# Altium footprint library pcblib.PcbLib: 92 footprints (part 6 of 6)
Each footprint in its own frame and in the unit in brackets; x right, y up, seen from the top. Pads: shape width x height; smd on the part's side, far side on the other; paste and mask are expansions set on the pad; w line width, h text height; cw(c..) or ccw(c..) is an arc to the next point about the centre after c.
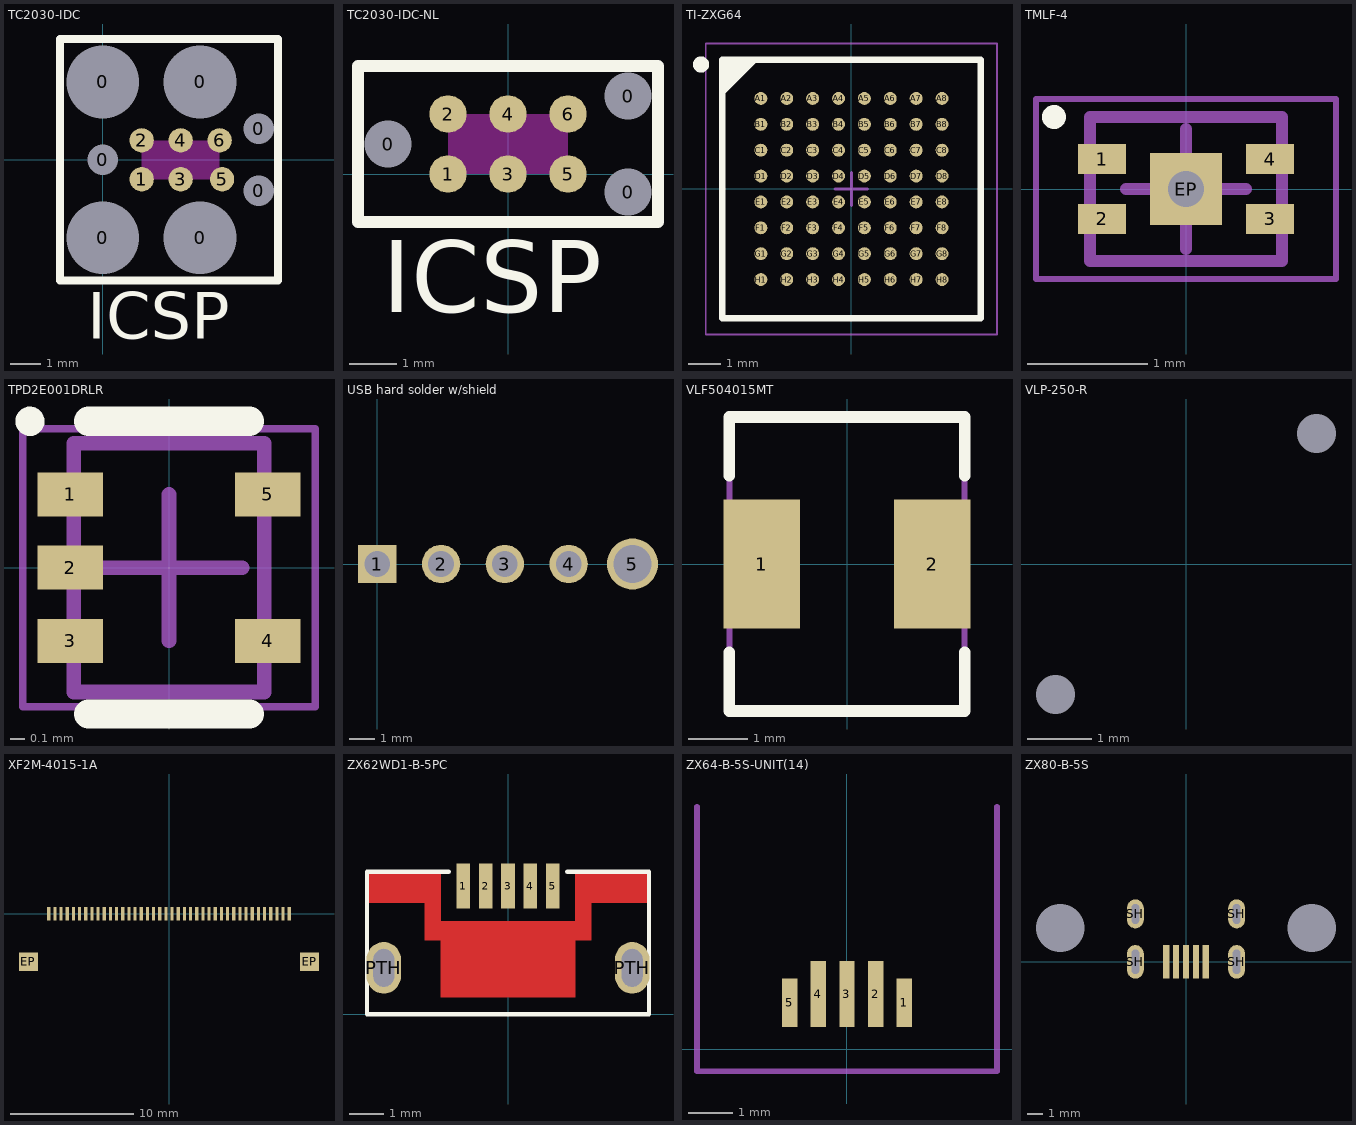
[diagram p5: the footprints below, top view; thin cyan lines are the x and y axes]

## TC2030-IDC [mm] "Tag-Connect 6-Pin with Legs (PN# TC2030-IDC-NL)"
pads (13):
  round 2.3 hole 2.375 unplated: 0(0,-2.54) 0(0,2.54) 0(3.175,-2.54) 0(3.175,2.54)
  round 0.9 hole 0.995 unplated: 0(0,0) 0(5.08,-1.016) 0(5.08,1.016)
  round 0.79 smd paste-0.39 mask-0.102: 1(1.27,-0.635)
  round 0.79 smd paste-0.39: 2(1.27,0.635) 3(2.54,-0.635) 4(2.54,0.635) 5(3.89,-0.635) 6(3.81,0.635)
Top Overlay:
  lines w0.254: -1.397,-3.937 -1.397,3.937 5.715,3.937 5.715,-3.937 -1.397,-3.937
  text "ICSP" at -0.508,-5.842 h1.52
Keep-Out Layer:
  rectangle: 1.27,-0.635 3.81,0.635

## TC2030-IDC-NL [mm] "Tag-Connect 6-Pin with No Legs (PN# TC2030-IDC-NL)"
pads (9):
  round 0.9 hole 0.995 unplated: 0(-2.54,0.635) 0(2.54,-0.381) 0(2.54,1.651)
  round 0.79 smd paste-0.39: 1(-1.27,0) 2(-1.27,1.27) 3(0,0) 4(0,1.27) 5(1.27,0) 6(1.27,1.27)
Top Overlay:
  lines w0.254: -3.175,-1.016 -3.175,2.286 3.175,2.286 3.175,-1.016 -3.175,-1.016
  text "ICSP" at -2.667,-2.921 h1.52
Keep-Out Layer:
  rectangle: -1.27,0 1.27,1.27

## TI-ZXG64 [mm] "BGA, 64-Balls, Body 8x8mm, Pitch 0.8mm"
height 1.45
pads (64):
  round 0.4 smd: A1(-2.8,2.8) A2(-2,2.8) A3(-1.2,2.8) A4(-0.4,2.8) A5(0.4,2.8) A6(1.2,2.8) A7(2,2.8) A8(2.8,2.8) B1(-2.8,2) B2(-2,2) B3(-1.2,2) B4(-0.4,2) B5(0.4,2) B6(1.2,2) B7(2,2) B8(2.8,2) C1(-2.8,1.2) C2(-2,1.2) C3(-1.2,1.2) C4(-0.4,1.2) C5(0.4,1.2) C6(1.2,1.2) C7(2,1.2) C8(2.8,1.2) D1(-2.8,0.4) D2(-2,0.4) D3(-1.2,0.4) D4(-0.4,0.4) D5(0.4,0.4) D6(1.2,0.4) D7(2,0.4) D8(2.8,0.4) E1(-2.8,-0.4) E2(-2,-0.4) E3(-1.2,-0.4) E4(-0.4,-0.4) E5(0.4,-0.4) E6(1.2,-0.4) E7(2,-0.4) E8(2.8,-0.4) F1(-2.8,-1.2) F2(-2,-1.2) F3(-1.2,-1.2) F4(-0.4,-1.2) F5(0.4,-1.2) F6(1.2,-1.2) F7(2,-1.2) F8(2.8,-1.2) G1(-2.8,-2) G2(-2,-2) G3(-1.2,-2) G4(-0.4,-2) G5(0.4,-2) G6(1.2,-2) G7(2,-2) G8(2.8,-2) H1(-2.8,-2.8) H2(-2,-2.8) H3(-1.2,-2.8) H4(-0.4,-2.8) H5(0.4,-2.8) H6(1.2,-2.8) H7(2,-2.8) H8(2.8,-2.8)
Top Overlay:
  circle w0.25: c-4.65,3.85 r0.125
  region: -3,4 -4,3 -4,4
  lines w0.2: -4,3 -3,4 ; -4,-4 4,-4 4,4 -4,4 -4,-4
Mechanical 13:
  lines w0.1: -4,-4 4,-4 4,4 -4,4 -4,-4
Mechanical 15:
  lines w0.05: -4.5,-4.5 4.5,-4.5 4.5,4.5 -4.5,4.5 -4.5,-4.5
  lines w0.1: -0.5,0 0.5,0 ; 0,-0.5 0,0.5
3D body: height 1.45, standoff 0.31, extent -4,-4 4,4

## TMLF-4 [mm] "4-Pin 1.2mm x 1.6mm Thin MLF"
height 0.55
pads (5):
  rect 0.4x0.25 smd: 1(-0.7,0.25) 2(-0.7,-0.25) 3(0.7,-0.25) 4(0.7,0.25)
  rect 0.6x0.6 smd: EP(0,0)
via 0,0 diameter 0.4 hole 0.3
Top Overlay:
  circle w0.1: c-1.1,0.6 r0.05
Mechanical 13:
  lines w0.1: -0.8,-0.6 -0.8,0.6 0.8,0.6 0.8,-0.6 -0.8,-0.6
Mechanical 15:
  lines w0.05: -1.25,-0.75 -1.25,0.75 1.25,0.75 1.25,-0.75 -1.25,-0.75
  lines w0.1: -0.5,0 0.5,0 ; 0,-0.5 0,0.5
3D body: height 1.5, standoff 0, extent -0.6,-0.6 0.7,0.6
3D body: height 0.55, standoff 0, extent -0.8,-0.6 0.8,0.6

## TPD2E001DRLR [mm] "SOTFL, 5-Flat Leads, Body 1.2x1.6x0.6mm, Pitch 0.5mm, TI Recommended"
height 0.6
pads (5):
  rect 0.45x0.3 smd: 1(-0.675,0.5) 2(-0.675,0) 3(-0.675,-0.5) 4(0.675,-0.5) 5(0.675,0.5)
Top Overlay:
  circle w0.1: c-0.95,1 r0.05
  lines w0.2: -0.55,-1 0.55,-1 ; -0.55,1 0.55,1
Mechanical 13:
  lines w0.1: -0.65,-0.85 0.65,-0.85 0.65,0.85 -0.65,0.85 -0.65,-0.85
Mechanical 15:
  lines w0.05: -1,-0.95 1,-0.95 1,0.95 -1,0.95 -1,-0.95
  lines w0.1: -0.5,0 0.5,0 ; 0,-0.5 0,0.5
3D body: height 0.6, standoff 0, extent -0.65,-0.85 0.65,0.85

## USB hard solder w/shield [mm] "Vias for USB with additional via for Shield"
pads (5):
  rect 1.53x1.53 hole 1.02: 1(0,0)
  round 1.53 hole 1.02: 2(2.54,0) 3(5.08,0) 4(7.62,0)
  round 2.032 hole 1.524: 5(10.16,0)

## VLF504015MT [mm] "SMD INDUCTOR, 2-Leads, Body 4x5mm"
height 1.5
pads (2):
  rect 1.3x2.2 smd: 1(-1.45,0) 2(1.45,0)
Top Overlay:
  lines w0.2: -2,-1.5 -2,-2.5 2,-2.5 2,-1.5 ; -2,1.5 -2,2.5 2,2.5 2,1.5
Mechanical 13:
  lines w0.1: -2,-2.5 -2,2.5 2,2.5 2,-2.5 -2,-2.5
3D body: height 1.5, standoff 0, extent -2,-2.5 2,2.5

## VLP-250-R [mil] "LIGHT PIPE VERTICAL .250\" ROUND"
pads (2):
  round 0 hole 24 unplated: MH(-80,-80) MH(80,80)
3D body: height 250, standoff -60, extent -93,-92 92,93

## XF2M-4015-1A [mm] "CONN FPC 40POS 0.5MM PITCH SMD"
pads (42):
  rect 0.25x1.1 smd: 1(9.75,0) 2(9.25,0) 3(8.75,0) 4(8.25,0) 5(7.75,0) 6(7.25,0) 7(6.75,0) 8(6.25,0) 9(5.75,0) 10(5.25,0) 11(4.75,0) 12(4.25,0) 13(3.75,0) 14(3.25,0) 15(2.75,0) 16(2.25,0) 17(1.75,0) 18(1.25,0) 19(0.75,0) 20(0.25,0) 21(-0.25,0) 22(-0.75,0) 23(-1.25,0) 24(-1.75,0) 25(-2.25,0) 26(-2.75,0) 27(-3.25,0) 28(-3.75,0) 29(-4.25,0) 30(-4.75,0) 31(-5.25,0) 32(-5.75,0) 33(-6.25,0) 34(-6.75,0) 35(-7.25,0) 36(-7.75,0) 37(-8.25,0) 38(-8.75,0) 39(-9.25,0) 40(-9.75,0)
  rect 1.524x1.5 smd: EP(-11.4,-3.9) EP(11.4,-3.9)
3D body: height 2, standoff 0, extent -12.05,-4.96 12.05,0.94

## ZX62WD1-B-5PC [mm] "CONN RCPT MICRO USB B SPLASH PRF"
pads (7):
  rect 0.4x1.3 smd: 1(-1.3,3.73) 2(-0.65,3.73) 3(0,3.73) 4(0.65,3.73) 5(1.3,3.73)
  oval 1x1.5 hole 0.6 slot 1.1 at 90 deg: PTH(-3.61,1.35) PTH(3.61,1.35)
Top Layer:
  region: -4.1,4.15 -4.1,3.25 -2.425,3.25 -2.425,2.15 -1.95,2.15 -1.95,0.5 1.95,0.5 1.95,2.15 2.425,2.15 2.425,3.25 4.1,3.25 4.1,4.15 1.95,4.15 1.95,2.7 -1.95,2.7 -1.95,4.15
Top Overlay:
  lines w0.127: -4.1,4.125 -4.1,0 4.1,0 4.1,4.15 1.725,4.15 ; -4.1,4.15 -1.725,4.15
3D body: height 2.97, standoff -0.55, extent -4.1,-0.85 4.1,4.15

## ZX64-B-5S-UNIT(14) [mm] "Connector Plug USB - micro B 2.0 5 Position Surface Mount, Right Angle, Horizontal"
pads (5):
  rect 0.35x1.1 smd: 1(1.3,1.05) 5(-1.3,1.05)
  rect 0.35x1.5 smd: 2(0.65,1.25) 3(0,1.25) 4(-0.65,1.25)
Mechanical 4:
  lines w0.127: -3.4,5.5 -3.4,-0.5 3.4,-0.5 3.4,5.5
3D body: height 2.75, standoff -1.35, extent -4.175,-13.3 4.225,2.8

## ZX80-B-5S [mm] "Connector Receptacle USB - micro B 2.0 5 Position Through Hole, Vertical"
pads (11):
  rect 0.4x2.2 smd: 1(-1.3,0) 2(-0.65,0) 3(0,0) 4(0.65,0) 5(1.3,0)
  oval 1.1x2.2 hole 0.5 slot 1.6 at 90 deg: SH(-3.325,0) SH(3.325,0)
  oval 1.1x1.9 hole 0.5 slot 1.3 at 90 deg: SH(-3.325,3.15) SH(3.325,3.15)
  round 0 hole 3.175 unplated: TH(-8.275,2.23) TH(8.275,2.23)
3D body: height 12.99, standoff -1.16, extent -10.275,-0.925 10.275,5.375